# Altium footprint library Footprints.PcbLib: 236 footprints (part 3 of 15)
Each footprint in its own frame and in the unit in brackets; x right, y up, seen from the top. Pads: shape width x height; smd on the part's side, far side on the other; paste and mask are expansions set on the pad; w line width, h text height; cw(c..) or ccw(c..) is an arc to the next point about the centre after c.
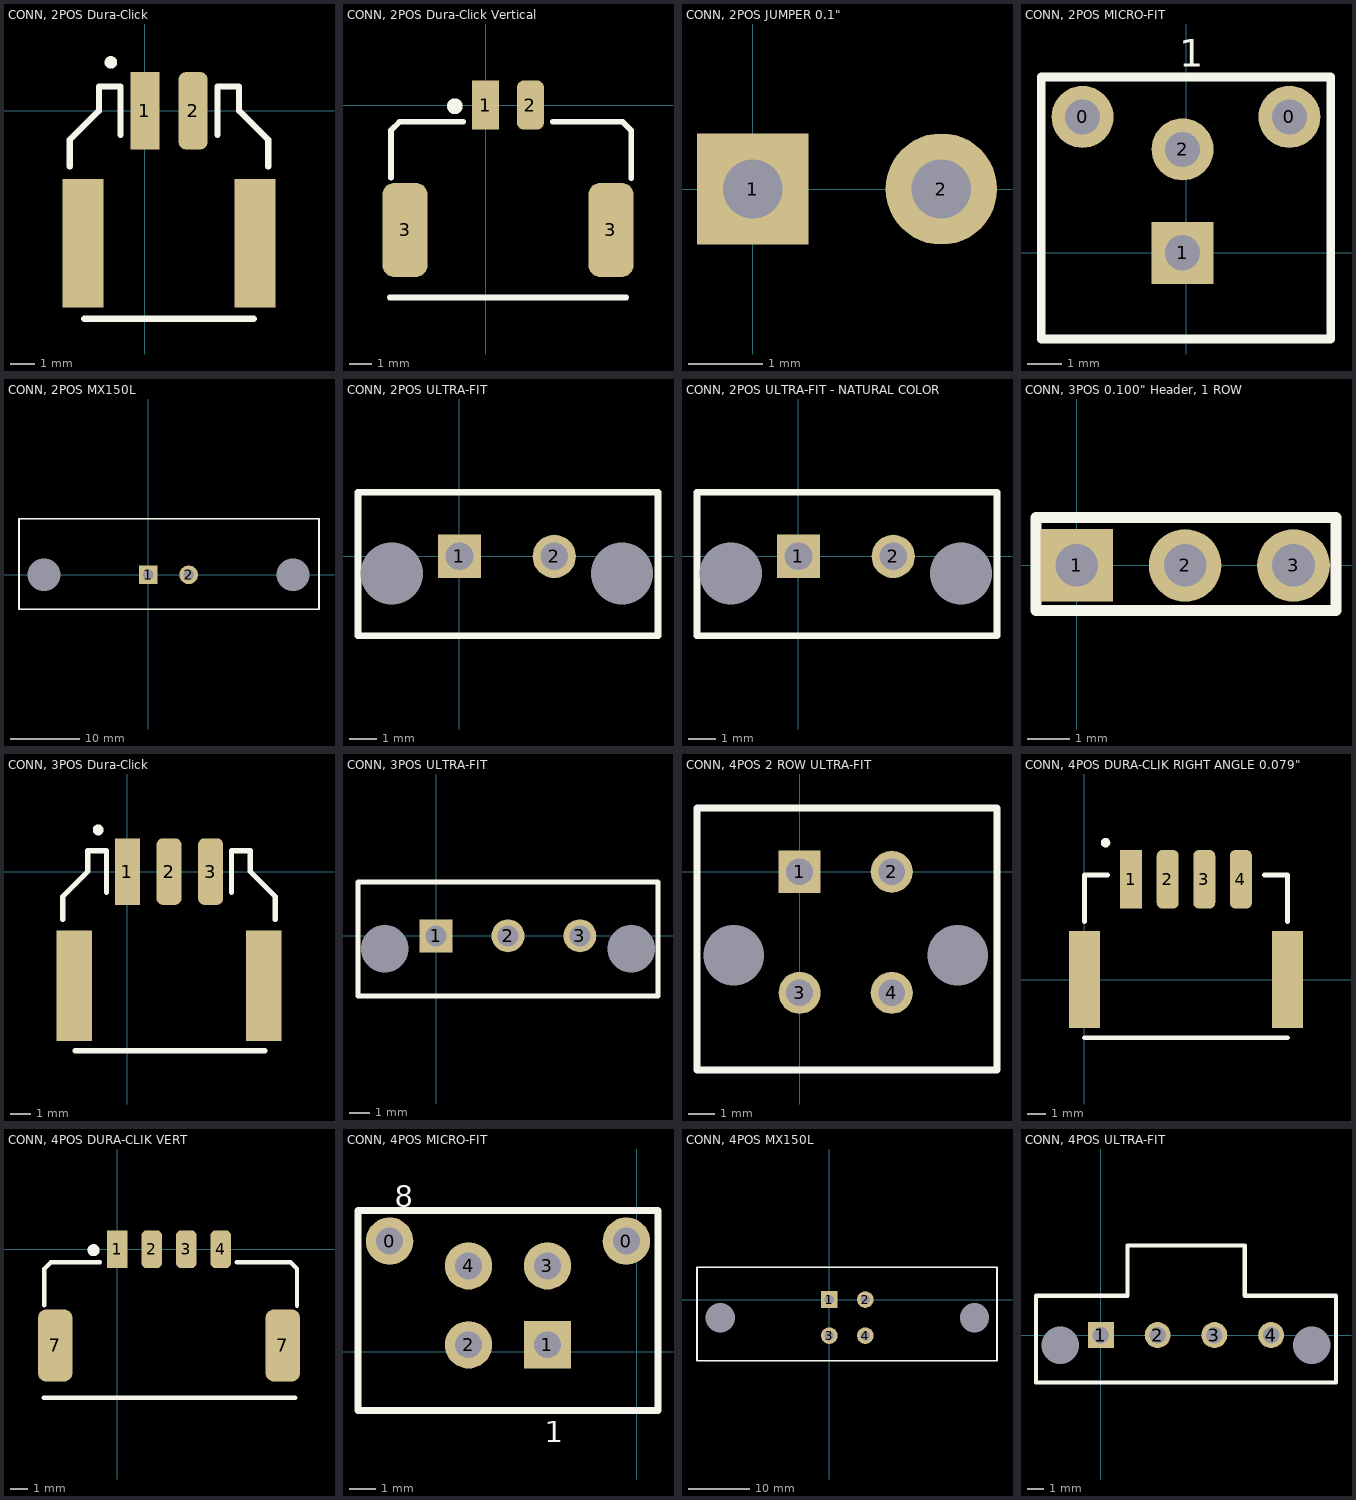
[diagram p2: the footprints below, top view; thin cyan lines are the x and y axes]

## CONN, 2POS Dura-Click [mm] "WM7169CT-ND"
pads (4):
  rect 1.2x3.2 smd: 1(0,0)
  rrect50% 1.2x3.2 smd: 2(2,0)
  rect 1.7x5.3 smd: ""(-2.55,-5.48) ""(4.55,-5.48)
Top Overlay:
  circle w0.26: c-1.4,2 r0.13
  lines w0.254: -3.1,-2.3 -3.1,-1.2 -1.9,0 -1.9,1 -1,1 -1,-1 ; -2.5,-8.6 4.5,-8.6 ; 3,-1 3,1 3.9,1 3.9,0 5.1,-1.2 5.1,-2.3
3D body "5023520200.stp": height 6.39, standoff -0.01, extent -3,-8.4 5,1

## CONN, 2POS Dura-Click Vertical [mm] "WM7169CT-ND"
pads (4):
  rect 1.2x2.2 smd: 1(0,0)
  rrect50% 1.2x2.2 smd: 2(2,0)
  rrect50% 2x4.2 smd: 3(-3.6,-5.58) 3(5.6,-5.58)
Top Overlay:
  circle w0.5: c-1.375,-0.05 r0.1
  lines w0.254: -4.275,-8.6 6.275,-8.6 ; -4.225,-3.25 -4.225,-1.125 -3.85,-0.75 -1,-0.75 ; 3,-0.75 6.125,-0.75 6.5,-1.125 6.5,-3.275
3D body "5600200220.stp": height 8, standoff 0, extent -4.45,-8.635 6.45,0.515

## CONN, 2POS JUMPER 0.1" [mm]
pads (2):
  rect 1.5x1.5 hole 0.8: 1(0,0)
  round 1.5 hole 0.8: 2(2.54,0)
3D body "901310921.stp": height 9.25, standoff -2.9, extent -1.24,-1.27 3.84,1.27

## CONN, 2POS MICRO-FIT [mm]
pads (4):
  round 1.8 hole 1.02: 0(-3,3.94) 0(3,3.94) 2(-0.1,3)
  rect 1.8x1.8 hole 1.02: 1(-0.1,0)
Top Overlay:
  lines w0.254: -4.2,-2.5 4.2,-2.5 4.2,5.1 -4.2,5.1 -4.2,-2.5
  text "1" at -0.2,5.4 h0.8
3D body "430450227.stp": height 9.95, standoff -3.14, extent -3.675,-2.47 3.475,6.3

## CONN, 2POS MX150L [mm]
pads (4):
  rect 2.7x2.7 hole 1.52: 1(0,0)
  round 2.7 hole 1.52: 2(5.84,0)
  round 0 hole 4.78: ""(-15.15,0) ""(20.99,0)
Top Overlay:
  lines w0.254: -18.796,-5 24.765,-5 24.765,8.128 -18.796,8.128 -18.796,-5
3D body "194270109.stp": height 29.78, standoff -3.42, extent -18.669,-31.662 24.511,8.001

## CONN, 2POS ULTRA-FIT [mm] "2 Positions Header, Shrouded Connector 0.138\" (3.50mm) Through Hole Gold"
pads (4):
  rect 1.6x1.6 hole 1.02: 1(0,0)
  round 1.6 hole 1.02: 2(3.5,0)
  round 1.6 hole 2.3: ""(-2.5,-0.63) ""(6,-0.63)
Top Overlay:
  lines w0.254: 3.5,2.37 7.33,2.37 7.33,-2.93 -3.745,-2.93 -3.745,2.37 4.5,2.37
3D body "1722871102.stp": height 13.85, standoff -3.3, extent -3.482,-2.865 7.118,5.795

## CONN, 2POS ULTRA-FIT - NATURAL COLOR [mm] "2 Positions Header, Shrouded Connector 0.138\" (3.50mm) Through Hole Gold"
pads (4):
  rect 1.6x1.6 hole 1.02: 1(0,0)
  round 1.6 hole 1.02: 2(3.5,0)
  round 1.6 hole 2.3: ""(-2.5,-0.63) ""(6,-0.63)
Top Overlay:
  lines w0.254: 3.5,2.37 7.33,2.37 7.33,-2.93 -3.745,-2.93 -3.745,2.37 4.5,2.37
3D body "1722871102.stp": height 13.85, standoff -3.3, extent -3.482,-2.865 7.118,5.795

## CONN, 3POS 0.100" Header, 1 ROW [mm] "Connector, 3 position 0.1\" (2.54mm) Through Hole Generic Header"
pads (3):
  rect 1.7x1.7 hole 1: 1(0,0)
  round 1.7 hole 1: 2(2.54,0) 3(5.08,0)
Top Overlay:
  lines w0.254: -0.955,-1.059 -0.955,1.121 5.974,1.121 6.076,1.121 6.076,-1.059 -0.955,-1.059

## CONN, 3POS Dura-Click [mm] "WM10858CT-ND"
pads (5):
  rect 1.2x3.2 smd: 1(0,0)
  rrect50% 1.2x3.2 smd: 2(2,0) 3(4,0)
  rect 1.7x5.3 smd: ""(-2.55,-5.48) ""(6.55,-5.48)
Top Overlay:
  circle w0.26: c-1.4,2 r0.13
  lines w0.254: -3.1,-2.3 -3.1,-1.2 -1.9,0 -1.9,1 -1,1 -1,-1 ; -2.5,-8.6 6.6,-8.6 ; 5,-1 5,1 5.9,1 5.9,0 7.1,-1.2 7.1,-2.3
3D body "5023520300.stp": height 6.38, standoff -0.02, extent -3,-8.5 7,0.9

## CONN, 3POS ULTRA-FIT [mm]
pads (5):
  rect 1.6x1.6 hole 1.02: 1(0,0)
  round 1.6 hole 1.02: 2(3.5,0) 3(7,0)
  round 0 hole 2.3: ""(-2.5,-0.63) ""(9.5,-0.63)
Top Overlay:
  lines w0.254: -3.8,-2.93 -3.8,2.62 -0.1,2.62 7.125,2.62 10.8,2.62 10.8,-2.93 -3.8,-2.93
3D body "1722871103.stp": height 13.85, standoff -3.3, extent -3.55,-2.675 10.55,5.985

## CONN, 4POS 2 ROW ULTRA-FIT [mm]
pads (6):
  rect 1.6x1.6 hole 1.02: 1(0,0)
  round 1.6 hole 1.02: 2(3.5,0) 3(0,-4.6) 4(3.5,-4.6)
  round 0 hole 2.3: ""(-2.5,-3.18) ""(6,-3.18)
Top Overlay:
  lines w0.254: -3.9,-7.53 7.5,-7.53 7.5,2.42 -3.9,2.42 -3.9,-7.53
3D body "1722991104.stp": height 13.9, standoff -3.3, extent -3.55,-8.15 7.05,5.76

## CONN, 4POS DURA-CLIK RIGHT ANGLE 0.079" [mm]
pads (6):
  rect 1.2x3.2 smd: 1(2.55,5.48)
  rrect50% 1.2x3.2 smd: 2(4.55,5.48) 3(6.55,5.48) 4(8.55,5.48)
  rect 1.7x5.3 smd: ""(0,0) ""(11.1,0)
Top Overlay:
  circle w0.26: c1.15,7.48 r0.13
  lines w0.254: 0,-3.175 11.1,-3.175 ; 0,3.175 0,5.715 1.27,5.715 ; 9.83,5.715 11.1,5.715 11.1,3.175
3D body "5023520400.stp": height 6.36, standoff -0.04, extent -0.412,-3.322 11.588,6.078

## CONN, 4POS DURA-CLIK VERT [mm]
height 8
pads (6):
  rect 1.2x2.2 smd: 1(0,0)
  rrect50% 1.2x2.2 smd: 2(2,0) 3(4,0) 4(6,0)
  rrect50% 2x4.2 smd: 7(-3.6,-5.58) 7(9.6,-5.58)
Top Overlay:
  circle w0.5: c-1.375,-0.05 r0.1
  lines w0.254: -4.275,-8.61 10.325,-8.61 ; -4.225,-3.25 -4.225,-1.125 -3.85,-0.75 -1,-0.75 ; 6.925,-0.75 10.05,-0.75 10.425,-1.125 10.425,-3.275
3D body "5600200420.stp": height 8, standoff 0, extent -4.275,-8.61 10.325,0.54

## CONN, 4POS MICRO-FIT [mm]
pads (6):
  round 1.8 hole 1.02: 0(-9.4,4.2) 0(-0.4,4.2) 2(-6.4,0.26) 3(-3.4,3.26) 4(-6.4,3.26)
  rect 1.8x1.8 hole 1.02: 1(-3.4,0.26)
Top Overlay:
  lines w0.254: -10.6,-2.24 -10.6,5.36 0.8,5.36 0.8,-2.24 -10.6,-2.24
  text "1" at -3.5,-3.44 h0.8
  text "8" at -9.2,5.5 h0.8
3D body "430450427.stp": height 9.95, standoff -3.14, extent -10.05,-2.785 0.1,5.985

## CONN, 4POS MX150L [mm]
pads (6):
  rect 2.7x2.7 hole 1.52: 1(0,0)
  round 2.7 hole 1.52: 2(5.84,0) 3(0,-5.85) 4(5.84,-5.85)
  round 0 hole 4.78: ""(-17.69,-2.925) ""(23.53,-2.925)
Top Overlay:
  lines w0.254: -21.463,-9.906 27.178,-9.906 27.178,5.207 -21.463,5.207 -21.463,-9.906
3D body "194270032.stp": height 32.31, standoff -3.3, extent -21.26,-34.595 27,5.055

## CONN, 4POS ULTRA-FIT [mm]
pads (6):
  rect 1.6x1.6 hole 1.02: 1(0,0)
  round 1.6 hole 1.02: 2(3.5,0) 3(7,0) 4(10.5,0)
  round 0 hole 2.3: ""(-2.5,-0.63) ""(13,-0.63)
Top Overlay:
  lines w0.254: -4,-2.93 14.5,-2.93 14.5,2.425 8.875,2.425 8.875,5.525 1.65,5.525 1.65,2.425 -4,2.425 -4,-2.93
3D body "1722871104.stp": height 13.85, standoff -3.3, extent -3.54,-2.78 14.06,5.88